# Altium footprint library SILICA_PCBLIB.PcbLib: 161 footprints (part 10 of 11)
Each footprint in its own frame and in the unit in brackets; x right, y up, seen from the top. Pads: shape width x height; smd on the part's side, far side on the other; paste and mask are expansions set on the pad; w line width, h text height; cw(c..) or ccw(c..) is an arc to the next point about the centre after c.
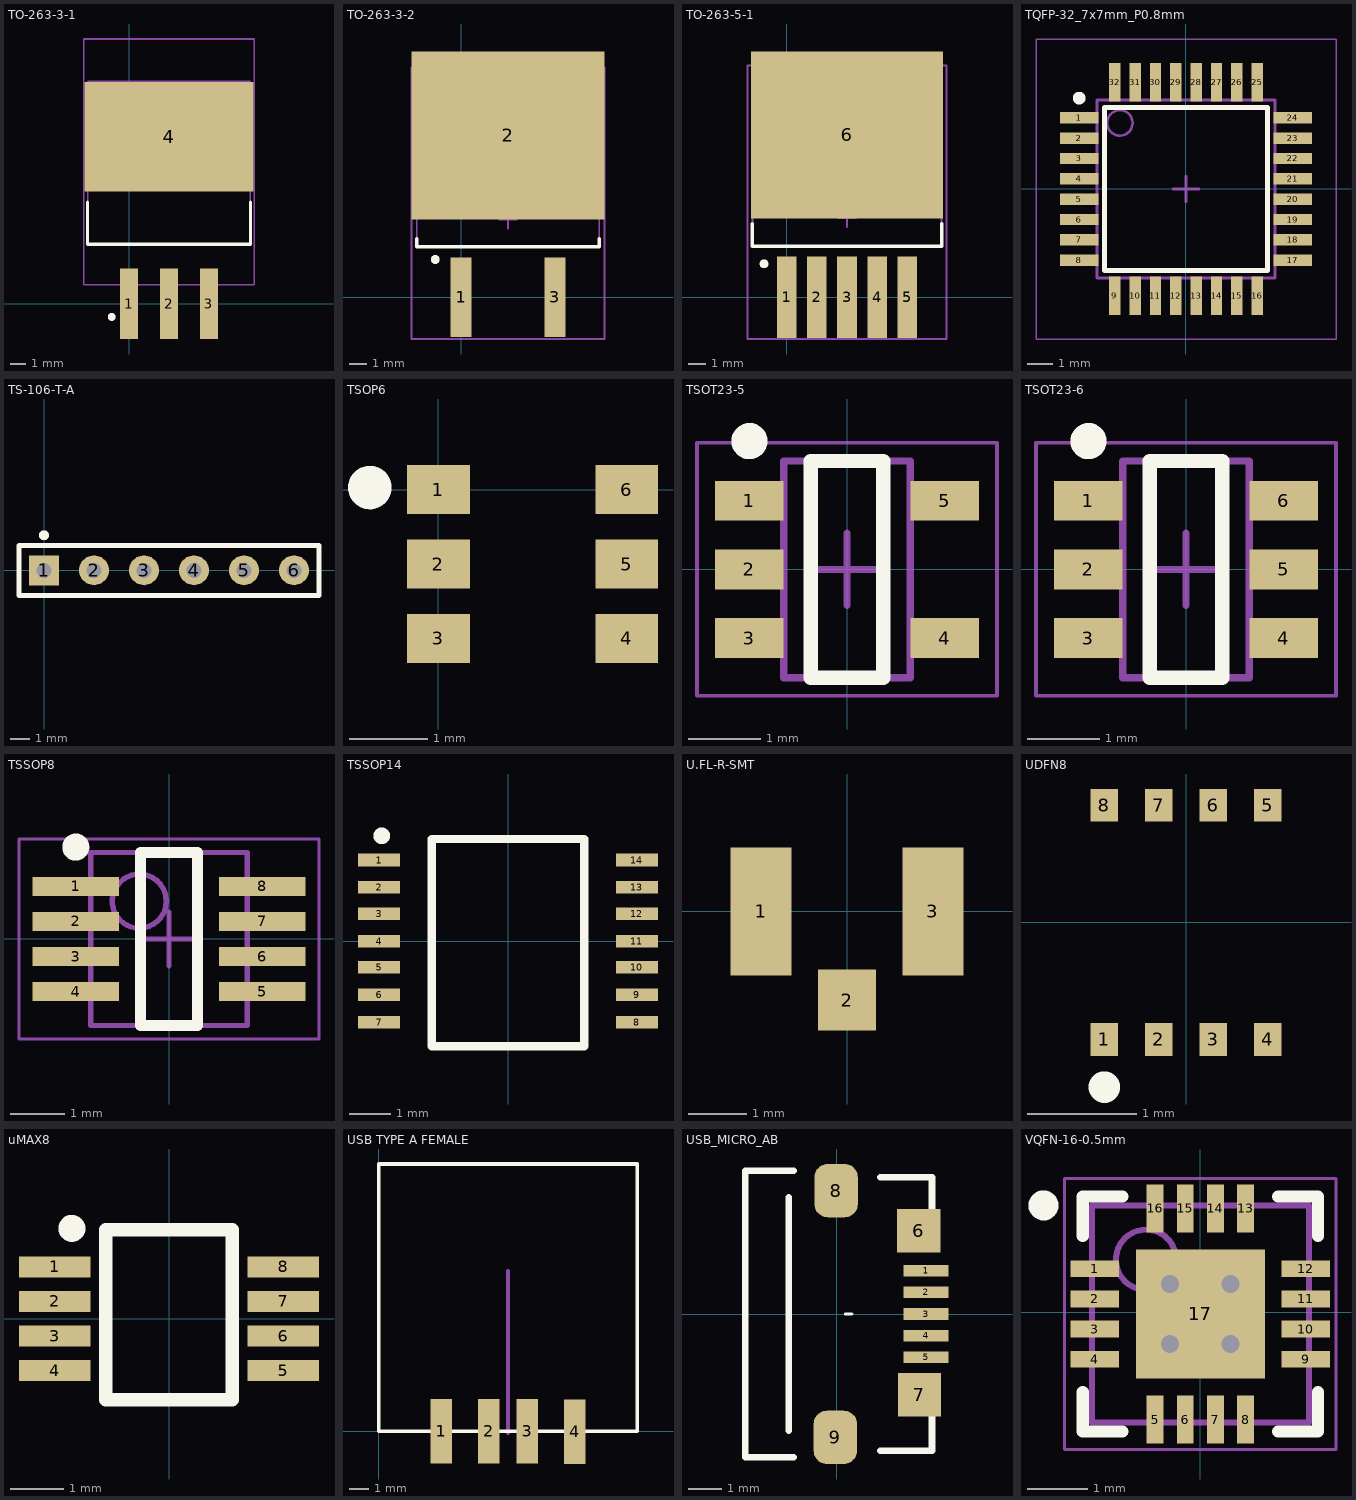
[diagram p9: the footprints below, top view; thin cyan lines are the x and y axes]

## TO-263-3-1 [mm]
height 4.65
pads (4):
  rect 1.15x4.5 smd paste-0.051 mask+0: 1(0,0) 2(2.54,0) 3(5.08,0)
  rect 10.8x6.99 smd paste-0.051 mask+0: 4(2.54,10.675)
Top Overlay:
  circle w0.25: c-1.115,-0.84 r0.125
  lines w0.2: -2.66,6.501 -2.66,3.801 7.74,3.801 7.74,6.501
Mechanical 13:
  lines w0.1: -2.66,3.801 7.74,3.801 ; -2.66,6 -2.66,14.21 7.74,14.21 7.74,6
Mechanical 15:
  lines w0.1: 2.04,9.01 3.04,9.01 ; 2.54,8.51 2.54,9.51 ; -2.91,1.2 7.99,1.2 7.99,16.9 -2.91,16.9 -2.91,1.2
3D body "SW3dPS-to-263.STEP": height 6.29, standoff 1.6, extent -2.54,-1.564 7.62,13.876

## TO-263-3-2 [mm]
height 4.572
pads (3):
  rect 1.2x4.5 smd paste-0.051 mask+0: 1(0,0) 3(5.3,0)
  rect 10.9x9.5 smd paste-0.051 mask+0: 2(2.65,9.15)
Top Overlay:
  circle w0.25: c-1.465,2.141 r0.125
  lines w0.2: -2.5,3.3 -2.5,2.85 7.8,2.85 7.8,3.3
Mechanical 13:
  lines w0.1: -2.5,12.303 -2.5,2.853 7.8,2.853 7.8,12.303 ; -2.5,12.306 7.8,12.306
Mechanical 15:
  lines w0.1: 2.15,4.4 3.15,4.4 ; 2.65,3.9 2.65,4.9 ; -2.8,-2.349 8.1,-2.349 8.1,13 -2.8,13 -2.8,-2.349
3D body "SW3dPS-DPAK.STEP": height 4.98, standoff -0.03, extent -2.43,-1.838 7.73,13.426

## TO-263-5-1 [mm]
height 4.597
pads (6):
  rect 1.1x4.6 smd paste-0.051 mask+0: 1(0,0) 2(1.7,0) 3(3.4,0) 4(5.1,0) 5(6.8,0)
  rect 10.8x9.4 smd paste-0.051 mask+0: 6(3.4,9.15)
Top Overlay:
  circle w0.25: c-1.274,1.887 r0.125
  lines w0.2: -1.95,4.15 -1.95,2.885 8.75,2.885 8.75,4.15
Mechanical 13:
  lines w0.1: -1.925,2.9 8.725,2.9 8.725,12.07 -1.925,12.07 -1.925,2.9
Mechanical 15:
  lines w0.1: 2.9,4.45 3.9,4.45 ; 3.4,3.95 3.4,4.95 ; -2.2,-2.349 9,-2.349 9,13.05 -2.2,13.05 -2.2,-2.349
3D body "User Library-TO-263-5.STEP": height 4.56, standoff 0, extent -1.68,-0.942 8.48,13.073

## TQFP-32_7x7mm_P0.8mm [mm] "32-Lead Plastic Thin Quad Flatpack (PT) - 7x7x1.0 mm Body, 2.00 mm [TQFP]"
height 1.2
pads (32):
  rect 1.5x0.45 smd: 1(-4.2,2.8) 2(-4.2,2) 3(-4.2,1.2) 4(-4.2,0.4) 5(-4.2,-0.4) 6(-4.2,-1.2) 7(-4.2,-2) 8(-4.2,-2.8) 17(4.2,-2.8) 18(4.2,-2) 19(4.2,-1.2) 20(4.2,-0.4) 21(4.2,0.4) 22(4.2,1.2) 23(4.2,2) 24(4.2,2.8)
  rect 0.45x1.5 smd: 9(-2.8,-4.2) 10(-2,-4.2) 11(-1.2,-4.2) 12(-0.4,-4.2) 13(0.4,-4.2) 14(1.2,-4.2) 15(2,-4.2) 16(2.8,-4.2) 25(2.8,4.2) 26(2,4.2) 27(1.2,4.2) 28(0.4,4.2) 29(-0.4,4.2) 30(-1.2,4.2) 31(-2,4.2) 32(-2.8,4.2)
Top Overlay:
  circle w0.25: c-4.2,3.575 r0.125
  lines w0.2: -3.2,-3.2 3.2,-3.2 3.2,3.213 -3.2,3.213 -3.2,-3.2
Mechanical 13:
  circle w0.1: c-2.6,2.6 r0.5
  lines w0.1: -3.5,-3.5 3.5,-3.5 3.5,3.5 -3.5,3.5 -3.5,-3.5
Mechanical 15:
  lines w0.05: -5.9,-5.9 5.9,-5.9 5.9,5.9 -5.9,5.9 -5.9,-5.9
  lines w0.1: -0.5,0 0.5,0 ; 0,-0.5 0,0.5
3D body "User Library-tqfp32.STEP": height 1.2, standoff 0, extent -4.587,-4.587 4.612,4.611

## TS-106-T-A [mil]
height 314.96
pads (6):
  rect 60x60 hole 30: 1(0,0)
  round 60 hole 30: 2(100,0) 3(200,0) 4(300,0) 5(400,0) 6(500,0)
Top Overlay:
  circle w10: c0,70 r5
  lines w10: -50,-50 -50,0 -50,50 550,50 550,-50 -50,-50
3D body "TS-106-X-A.step": height 326, standoff -204, extent -50,-50 550,50

## TSOP6 [mm]
pads (6):
  rect 0.8x0.63 smd: 1(0,0) 2(0,-0.95) 3(0,-1.9) 4(2.4,-1.9) 5(2.4,-0.95) 6(2.4,0)
Top Overlay:
  circle w0.254: c-0.875,0.025 r0.151
  circle w0.254: c-0.875,0.038 r0.04
3D body "User Library-TSOP-6.STEP": height 1, standoff 0, extent -0.137,-2.475 2.563,0.525

## TSOT23-5 [mm] "TSOT23, 5-Leads, Body 2.90x2.80mm, Pitch 0.95mm, IPC Medium Density"
height 1
pads (5):
  rect 0.95x0.55 smd: 1(-1.35,0.95) 2(-1.35,0) 3(-1.35,-0.95) 4(1.35,-0.95) 5(1.35,0.95)
Top Overlay:
  circle w0.25: c-1.35,1.775 r0.125
  lines w0.2: -0.5,-1.5 -0.5,1.5 0.5,1.5 0.5,-1.5 -0.5,-1.5
Mechanical 13:
  lines w0.1: -0.875,-1.5 0.875,-1.5 0.875,1.5 -0.875,1.5 -0.875,-1.5
Mechanical 15:
  lines w0.05: -2.075,-1.75 2.075,-1.75 2.075,1.75 -2.075,1.75 -2.075,-1.75
  lines w0.1: -0.5,0 0.5,0 ; 0,-0.5 0,0.5
3D body "User Library-tsot-23-5.STEP": height 0.93, standoff -0.05, extent -1.402,-1.45 1.397,1.45

## TSOT23-6 [mm] "TSOT23, 6-Leads, Body 2.90x2.80mm, Pitch 0.95mm, IPC Medium Density"
height 1
pads (6):
  rect 0.95x0.55 smd: 1(-1.35,0.95) 2(-1.35,0) 3(-1.35,-0.95) 4(1.35,-0.95) 5(1.35,0) 6(1.35,0.95)
Top Overlay:
  circle w0.25: c-1.35,1.775 r0.125
  lines w0.2: -0.5,-1.5 -0.5,1.5 0.5,1.5 0.5,-1.5 -0.5,-1.5
Mechanical 13:
  lines w0.1: -0.875,-1.5 0.875,-1.5 0.875,1.5 -0.875,1.5 -0.875,-1.5
Mechanical 15:
  lines w0.05: -2.075,-1.75 2.075,-1.75 2.075,1.75 -2.075,1.75 -2.075,-1.75
  lines w0.1: -0.5,0 0.5,0 ; 0,-0.5 0,0.5
3D body "User Library-TSOT-23-6(S6).STEP": height 1.08, standoff 0.08, extent -1.412,-1.45 1.412,1.45

## TSSOP8 [mm] "TSSOP, 8-Leads, Body 2.95x2.80mm, Pitch 0.65mm, IPC Medium Density"
height 1.3
pads (8):
  rect 1.6x0.35 smd paste-0.051 mask+0: 1(-1.725,0.975) 2(-1.725,0.325) 3(-1.725,-0.325) 4(-1.725,-0.975) 5(1.725,-0.975) 6(1.725,-0.325) 7(1.725,0.325) 8(1.725,0.975)
Top Overlay:
  circle w0.25: c-1.725,1.7 r0.125
  lines w0.2: -0.525,-1.6 -0.525,1.6 0.525,1.6 0.525,-1.6 -0.525,-1.6
Mechanical 13:
  circle w0.1: c-0.55,0.7 r0.5
  lines w0.1: -1.45,-1.6 -1.45,1.6 1.45,1.6 1.45,-1.6 -1.45,-1.6
Mechanical 15:
  lines w0.05: -2.775,-1.85 -2.775,1.85 2.775,1.85 2.775,-1.85 -2.775,-1.85
  lines w0.1: -0.5,0 0.5,0 ; 0,-0.5 0,0.5
3D body "SW3dPS-TSSOP8-1.STEP": height 1.1, standoff 0, extent -2.05,-1.55 2.05,1.55

## TSSOP14 [mil]
pads (14):
  rect 40x12 smd: 1(-122.5,77) 2(-122.5,51) 3(-122.5,26) 4(-122.5,0) 5(-122.5,-25) 6(-122.5,-51) 7(-122.5,-77) 8(122.5,-77) 9(122.5,-51) 10(122.5,-25) 11(122.5,0) 12(122.5,26) 13(122.5,51) 14(122.5,77)
Top Overlay:
  circle w8: c-120,100 r3.94
  lines w8: -72.5,-100 72.5,-100 72.5,97 -72.5,97 -72.5,-100
3D body: height 5.12, standoff 0, extent 101.5,-81.5 127,-72.5
3D body: height 25.59, standoff 0, extent 101.5,-81.5 106.5,-72.5
3D body: height 25.59, standoff 0, extent 101.5,-55.5 106.5,-46.5
3D body: height 5.12, standoff 0, extent 101.5,-55.5 127,-46.5
3D body: height 25.59, standoff 0, extent 101.5,-29.5 106.5,-20.5
3D body: height 5.12, standoff 0, extent 101.5,-29.5 127,-20.5
3D body: height 25.59, standoff 0, extent 101.5,-4.5 106.5,4.5
3D body: height 5.12, standoff 0, extent 101.5,-4.5 127,4.5
3D body: height 25.59, standoff 0, extent 101.5,21.5 106.5,30.5
3D body: height 5.12, standoff 0, extent 101.5,21.5 127,30.5
3D body: height 25.59, standoff 0, extent 101.5,46.5 106.5,55.5
3D body: height 5.12, standoff 0, extent 101.5,46.5 127,55.5
3D body: height 25.59, standoff 0, extent 101.5,72.5 106.5,81.5
3D body: height 5.12, standoff 0, extent 101.5,72.5 127,81.5
3D body: height 5.12, standoff 0, extent -127,-81.5 -101.5,-72.5
3D body: height 25.59, standoff 0, extent -106.5,-81.5 -101.5,-72.5
3D body: height 5.12, standoff 0, extent -127,-55.5 -101.5,-46.5
3D body: height 25.59, standoff 0, extent -106.5,-55.5 -101.5,-46.5
3D body: height 5.12, standoff 0, extent -127,-29.5 -101.5,-20.5
3D body: height 25.59, standoff 0, extent -106.5,-29.5 -101.5,-20.5
3D body: height 5.12, standoff 0, extent -127,-4.5 -101.5,4.5
3D body: height 25.59, standoff 0, extent -106.5,-4.5 -101.5,4.5
3D body: height 5.12, standoff 0, extent -127,21.5 -101.5,30.5
3D body: height 25.59, standoff 0, extent -106.5,21.5 -101.5,30.5
3D body: height 5.12, standoff 0, extent -127,46.5 -101.5,55.5
3D body: height 25.59, standoff 0, extent -106.5,46.5 -101.5,55.5
3D body: height 25.59, standoff 0, extent -106.5,72.5 -101.5,81.5
3D body: height 5.12, standoff 0, extent -127,72.5 -101.5,81.5
3D body "User Library-tssop14-2.STEP": height 47.24, standoff 0, extent -125.98,-101.89 125.99,98.9

## U.FL-R-SMT [mm]
pads (3):
  rect 1.05x2.2 smd: 1(-1.475,0) 3(1.475,0)
  rect 1x1.05 smd: 2(0,-1.525)
3D body "SW3dPS-U.FL-R-SMT-1.STEP": height 1.25, standoff -0.01, extent -1.5,-1.55 1.5,1.55

## UDFN8 [mm] "8-Lead Plastic Dual Flat, No  Lead Package - 2x3x0.5mm Body"
pads (8):
  rect 0.25x0.3 smd: 1(-0.75,-1.075) 2(-0.25,-1.075) 3(0.25,-1.075) 4(0.75,-1.075) 5(0.75,1.075) 6(0.25,1.075) 7(-0.25,1.075) 8(-0.75,1.075)
Top Overlay:
  circle w0.254: c-0.75,-1.512 r0.018
3D body "User Library-8MA3.STEP": height 0.6, standoff 0, extent -1,-1.51 1,1.51

## uMAX8 [mm] "uMAX 8 LEAD"
height 1.1
pads (8):
  rect 1.35x0.4 smd: 1(-2.15,0.975) 2(-2.15,0.325) 3(-2.15,-0.325) 4(-2.15,-0.975) 5(2.15,-0.975) 6(2.15,-0.325) 7(2.15,0.325) 8(2.15,0.975)
Top Overlay:
  circle w0.254: c-1.829,1.702 r0.127
  lines w0.254: -1.194,-1.524 -1.194,1.674 1.194,1.674 1.194,-1.524 -1.194,-1.524
3D body "User Library-uMAX8.STEP": height 0.95, standoff 0, extent -2.5,-1.425 2.5,1.575

## USB TYPE A FEMALE [mm]
pads (4):
  rect 1.12x3.39 smd: 1(3.275,0) 2(5.775,0) 3(7.775,0) 4(10.275,-0.025)
Top Overlay:
  lines w0.2: 0,0 0,14 13.55,14 13.55,0 0,0
Mechanical 1:
  lines w0.2: 6.775,-0.1 6.775,8.4
3D body "1-292303-6.stp": height 7.32, standoff -1.47, extent -1.78,-1.625 15.48,13.535

## USB_MICRO_AB [mm]
pads (9):
  rect 1.35x0.35 smd mask+0.025: 1(2.675,1.3) 2(2.675,0.65) 3(2.675,0) 4(2.675,-0.65) 5(2.675,-1.3)
  rect 1.3x1.3 smd mask+0.04: 6(2.45,2.5) 7(2.475,-2.425)
  rrect60% 1.3x1.6 smd: 8(-0.025,3.7) 9(-0.05,-3.7)
Top Overlay:
  lines w0.08: 0.25,0 0.45,0
  lines w0.2: -1.45,-3.5 -1.45,3.5 ; -1.3,-4.3 -2.75,-4.3 -2.75,4.3 -1.3,4.3 ; 1.3,-4.1 2.85,-4.1 2.85,-3 ; 1.3,4.1 2.85,4.1 2.85,3
3D body "User Library-Micro USB.STEP": height 2.71, standoff -0.23, extent -2.65,-3.99 2.78,3.99

## VQFN-16-0.5mm [mm]
pads (17):
  rect 0.8x0.28 smd paste-0.025 mask+0.07: 1(-1.75,0.725) 2(-1.75,0.225) 3(-1.75,-0.275) 4(-1.75,-0.775) 9(1.75,-0.775) 10(1.75,-0.275) 11(1.75,0.225) 12(1.75,0.725)
  rect 0.28x0.8 smd paste-0.025 mask+0.07: 5(-0.75,-1.775) 6(-0.25,-1.775) 7(0.25,-1.775) 8(0.75,-1.775) 13(0.75,1.725) 14(0.25,1.725) 15(-0.25,1.725) 16(-0.75,1.725)
  rect 2.14x2.14 smd paste-1.07 mask+0.07: 17(0,-0.025)
via 0.5,-0.525 diameter 0.4 hole 0.3
via -0.5,-0.525 diameter 0.4 hole 0.3
via 0.5,0.475 diameter 0.4 hole 0.3
via -0.5,0.475 diameter 0.4 hole 0.3
Top Overlay:
  circle w0.25: c-2.6,1.775 r0.125
  lines w0.2: -1.95,-1.315 -1.95,-1.975 -1.29,-1.975 ; -1.95,1.265 -1.95,1.925 -1.29,1.925 ; 1.29,-1.975 1.95,-1.975 1.95,-1.315 ; 1.29,1.925 1.95,1.925 1.95,1.265
Top Paste:
  rectangle: 0.15,0.125 1,0.975
  region: -0.15,0.975 -1,0.975 -1,0.125 -0.15,0.125
  rectangle: 0.15,-1.025 1,-0.175
  region: -0.15,-0.175 -1,-0.175 -1,-1.025 -0.15,-1.025
Mechanical 13:
  circle w0.1: c-0.9,0.875 r0.5
  lines w0.1: -1.8,-1.825 1.8,-1.825 1.8,1.775 -1.8,1.775 -1.8,-1.825
Mechanical 15:
  lines w0.05: -2.25,-2.275 2.25,-2.275 2.25,2.225 -2.25,2.225 -2.25,-2.275
  lines w0.1: -0.5,-0.025 0.5,-0.025 ; 0,-0.525 0,0.475
3D body "User Library-TPS65136.STEP": height 0.75, standoff -0.05, extent -1.582,-1.61 1.588,1.56